# Altium footprint library SAMTEC THD.PcbLib: 161 footprints (part 10 of 12) (continued)
## SAMTEC_TSW-110-07-L-D-LL [mm] "20 Contacts, Pitch 2.54mm - Dual Row, Through Mount Straigh Header" (continued)
  text "1" at -13.677,-1.768 h1.2
Mechanical 8:
  lines w0.05: -11.93,-1.27 -11.43,-1.27 ; -11.93,1.27 -11.43,1.27 ; -11.43,-1.77 -11.43,-1.27 ; -11.43,-0.77 -11.43,-1.27 ; -11.43,0.77 -11.43,1.27 ; -11.43,1.77 -11.43,1.27 ; -10.93,-1.27 -11.43,-1.27 ; -10.93,1.27 -11.43,1.27 ; -9.39,-1.27 -8.89,-1.27 ; -9.39,1.27 -8.89,1.27 ; -8.89,-1.77 -8.89,-1.27 ; -8.89,-0.77 -8.89,-1.27 ; -8.89,0.77 -8.89,1.27 ; -8.89,1.77 -8.89,1.27 ; -8.39,-1.27 -8.89,-1.27 ; -8.39,1.27 -8.89,1.27 ; -6.85,-1.27 -6.35,-1.27 ; -6.85,1.27 -6.35,1.27 ; -6.35,-1.77 -6.35,-1.27 ; -6.35,-0.77 -6.35,-1.27 ; -6.35,0.77 -6.35,1.27 ; -6.35,1.77 -6.35,1.27 ; -5.85,-1.27 -6.35,-1.27 ; -5.85,1.27 -6.35,1.27 ; -4.31,-1.27 -3.81,-1.27 ; -4.31,1.27 -3.81,1.27 ; -3.81,-1.77 -3.81,-1.27 ; -3.81,-0.77 -3.81,-1.27 ; -3.81,0.77 -3.81,1.27 ; -3.81,1.77 -3.81,1.27 ; -3.31,-1.27 -3.81,-1.27 ; -3.31,1.27 -3.81,1.27 ; -1.77,-1.27 -1.27,-1.27 ; -1.77,1.27 -1.27,1.27 ; -1.27,-1.77 -1.27,-1.27 ; -1.27,-0.77 -1.27,-1.27 ; -1.27,0.77 -1.27,1.27 ; -1.27,1.77 -1.27,1.27 ; -0.77,-1.27 -1.27,-1.27 ; -0.77,1.27 -1.27,1.27 ; -0.5,0 0,0 ; 0,-0.5 0,0 ; 0,0.5 0,0 ; 0.5,0 0,0 ; 0.77,-1.27 1.27,-1.27 ; 0.77,1.27 1.27,1.27 ; 1.27,-1.77 1.27,-1.27 ; 1.27,-0.77 1.27,-1.27 ; 1.27,0.77 1.27,1.27 ; 1.27,1.77 1.27,1.27 ; 1.77,-1.27 1.27,-1.27 ; 1.77,1.27 1.27,1.27 ; 3.31,-1.27 3.81,-1.27 ; 3.31,1.27 3.81,1.27 ; 3.81,-1.77 3.81,-1.27 ; 3.81,-0.77 3.81,-1.27 ; 3.81,0.77 3.81,1.27 ; 3.81,1.77 3.81,1.27 ; 4.31,-1.27 3.81,-1.27 ; 4.31,1.27 3.81,1.27 ; 5.85,-1.27 6.35,-1.27 ; 5.85,1.27 6.35,1.27 ; 6.35,-1.77 6.35,-1.27 ; 6.35,-0.77 6.35,-1.27 ; 6.35,0.77 6.35,1.27 ; 6.35,1.77 6.35,1.27 ; 6.85,-1.27 6.35,-1.27 ; 6.85,1.27 6.35,1.27 ; 8.39,-1.27 8.89,-1.27 ; 8.39,1.27 8.89,1.27 ; 8.89,-1.77 8.89,-1.27 ; 8.89,-0.77 8.89,-1.27 ; 8.89,0.77 8.89,1.27 ; 8.89,1.77 8.89,1.27 ; 9.39,-1.27 8.89,-1.27 ; 9.39,1.27 8.89,1.27 ; 10.93,-1.27 11.43,-1.27 ; 10.93,1.27 11.43,1.27 ; 11.43,-1.77 11.43,-1.27 ; 11.43,-0.77 11.43,-1.27 ; 11.43,0.77 11.43,1.27 ; 11.43,1.77 11.43,1.27 ; 11.93,-1.27 11.43,-1.27 ; 11.93,1.27 11.43,1.27
Mechanical 14:
  drawing of 389 lines, arcs and shapes, not listed
  text "1" at -13.677,-1.768 h1.2
3D body "SAMTEC_TSW-110-07-L-D-LL.stp": height 8.38, standoff -2.54, extent -12.7,-2.54 12.7,2.54

## SAMTEC_TSW-110-08-G-D [mm] "20 Contacts - Pitch 2.54mm - Dual Row  Through Mount Straigh Header (Post Lead 5.84mm, Tail Lead 5.08mm, Insulator 2.54mm)"
height 8.38
pads (20):
  round 1.7 hole 1: 1(-11.43,-1.27) 2(-11.43,1.27) 3(-8.89,-1.27) 4(-8.89,1.27) 5(-6.35,-1.27) 6(-6.35,1.27) 7(-3.81,-1.27) 8(-3.81,1.27) 9(-1.27,-1.27) 10(-1.27,1.27) 11(1.27,-1.27) 12(1.27,1.27) 13(3.81,-1.27) 14(3.81,1.27) 15(6.35,-1.27) 16(6.35,1.27) 17(8.89,-1.27) 18(8.89,1.27) 19(11.43,-1.27) 20(11.43,1.27)
Top Overlay:
  circle w0.3: c-11.395,-3.135 r0.15
  lines w0.2: -12.7,-2.54 -10.414,-2.54 -10.414,-2.286 -9.906,-2.286 -9.906,-2.54 -7.874,-2.54 -7.874,-2.286 -7.366,-2.286 -7.366,-2.54 -5.334,-2.54 -5.334,-2.286 -4.826,-2.286 -4.826,-2.54 -2.794,-2.54 -2.794,-2.286 -2.286,-2.286 -2.286,-2.54 -0.254,-2.54 -0.254,-2.286 0.254,-2.286 0.254,-2.54 2.286,-2.54 2.286,-2.286 2.794,-2.286 2.794,-2.54 4.826,-2.54 4.826,-2.286 5.334,-2.286 5.334,-2.54 7.366,-2.54 7.366,-2.286 7.874,-2.286 7.874,-2.54 9.906,-2.54 9.906,-2.286 10.414,-2.286 10.414,-2.54 12.7,-2.54 12.7,2.54 10.414,2.54 10.414,2.286 9.906,2.286 9.906,2.54 7.874,2.54 7.874,2.286 7.366,2.286 7.366,2.54 5.334,2.54 5.334,2.286 4.826,2.286 4.826,2.54 2.794,2.54 2.794,2.286 2.286,2.286 2.286,2.54 0.254,2.54 0.254,2.286 -0.254,2.286 -0.254,2.54 -2.286,2.54 -2.286,2.286 -2.794,2.286 -2.794,2.54 -4.826,2.54 -4.826,2.286 -5.334,2.286 -5.334,2.54 -7.366,2.54 -7.366,2.286 -7.874,2.286 -7.874,2.54 -9.906,2.54 -9.906,2.286 -10.414,2.286 -10.414,2.54 -12.7,2.54 -12.7,-2.54
  text "1" at -13.802,-1.768 h1.2
Mechanical 8:
  lines w0.05: -11.93,-1.27 -11.43,-1.27 ; -11.93,1.27 -11.43,1.27 ; -11.43,-1.77 -11.43,-1.27 ; -11.43,-0.77 -11.43,-1.27 ; -11.43,0.77 -11.43,1.27 ; -11.43,1.77 -11.43,1.27 ; -10.93,-1.27 -11.43,-1.27 ; -10.93,1.27 -11.43,1.27 ; -9.39,-1.27 -8.89,-1.27 ; -9.39,1.27 -8.89,1.27 ; -8.89,-1.77 -8.89,-1.27 ; -8.89,-0.77 -8.89,-1.27 ; -8.89,0.77 -8.89,1.27 ; -8.89,1.77 -8.89,1.27 ; -8.39,-1.27 -8.89,-1.27 ; -8.39,1.27 -8.89,1.27 ; -6.85,-1.27 -6.35,-1.27 ; -6.85,1.27 -6.35,1.27 ; -6.35,-1.77 -6.35,-1.27 ; -6.35,-0.77 -6.35,-1.27 ; -6.35,0.77 -6.35,1.27 ; -6.35,1.77 -6.35,1.27 ; -5.85,-1.27 -6.35,-1.27 ; -5.85,1.27 -6.35,1.27 ; -4.31,-1.27 -3.81,-1.27 ; -4.31,1.27 -3.81,1.27 ; -3.81,-1.77 -3.81,-1.27 ; -3.81,-0.77 -3.81,-1.27 ; -3.81,0.77 -3.81,1.27 ; -3.81,1.77 -3.81,1.27 ; -3.31,-1.27 -3.81,-1.27 ; -3.31,1.27 -3.81,1.27 ; -1.77,-1.27 -1.27,-1.27 ; -1.77,1.27 -1.27,1.27 ; -1.27,-1.77 -1.27,-1.27 ; -1.27,-0.77 -1.27,-1.27 ; -1.27,0.77 -1.27,1.27 ; -1.27,1.77 -1.27,1.27 ; -0.77,-1.27 -1.27,-1.27 ; -0.77,1.27 -1.27,1.27 ; -0.5,0 0,0 ; 0,-0.5 0,0 ; 0,0.5 0,0 ; 0.5,0 0,0 ; 0.77,-1.27 1.27,-1.27 ; 0.77,1.27 1.27,1.27 ; 1.27,-1.77 1.27,-1.27 ; 1.27,-0.77 1.27,-1.27 ; 1.27,0.77 1.27,1.27 ; 1.27,1.77 1.27,1.27 ; 1.77,-1.27 1.27,-1.27 ; 1.77,1.27 1.27,1.27 ; 3.31,-1.27 3.81,-1.27 ; 3.31,1.27 3.81,1.27 ; 3.81,-1.77 3.81,-1.27 ; 3.81,-0.77 3.81,-1.27 ; 3.81,0.77 3.81,1.27 ; 3.81,1.77 3.81,1.27 ; 4.31,-1.27 3.81,-1.27 ; 4.31,1.27 3.81,1.27 ; 5.85,-1.27 6.35,-1.27 ; 5.85,1.27 6.35,1.27 ; 6.35,-1.77 6.35,-1.27 ; 6.35,-0.77 6.35,-1.27 ; 6.35,0.77 6.35,1.27 ; 6.35,1.77 6.35,1.27 ; 6.85,-1.27 6.35,-1.27 ; 6.85,1.27 6.35,1.27 ; 8.39,-1.27 8.89,-1.27 ; 8.39,1.27 8.89,1.27 ; 8.89,-1.77 8.89,-1.27 ; 8.89,-0.77 8.89,-1.27 ; 8.89,0.77 8.89,1.27 ; 8.89,1.77 8.89,1.27 ; 9.39,-1.27 8.89,-1.27 ; 9.39,1.27 8.89,1.27 ; 10.93,-1.27 11.43,-1.27 ; 10.93,1.27 11.43,1.27 ; 11.43,-1.77 11.43,-1.27 ; 11.43,-0.77 11.43,-1.27 ; 11.43,0.77 11.43,1.27 ; 11.43,1.77 11.43,1.27 ; 11.93,-1.27 11.43,-1.27 ; 11.93,1.27 11.43,1.27
Mechanical 14:
  lines w0.1: -10.414,-2.286 -9.906,-2.286 ; -10.414,-0.508 -9.906,-0.508 ; -10.414,0.508 -9.906,0.508 ; -10.414,2.286 -9.906,2.286 ; -7.874,-2.286 -7.366,-2.286 ; -7.874,-0.508 -7.366,-0.508 ; -7.874,0.508 -7.366,0.508 ; -7.874,2.286 -7.366,2.286 ; -5.334,-2.286 -4.826,-2.286 ; -5.334,-0.508 -4.826,-0.508 ; -5.334,0.508 -4.826,0.508 ; -5.334,2.286 -4.826,2.286 ; -2.794,-2.286 -2.286,-2.286 ; -2.794,-0.508 -2.286,-0.508 ; -2.794,0.508 -2.286,0.508 ; -2.794,2.286 -2.286,2.286 ; -0.254,-2.286 0.254,-2.286 ; -0.254,-0.508 0.254,-0.508 ; -0.254,0.508 0.254,0.508 ; -0.254,2.286 0.254,2.286 ; 2.286,-2.286 2.794,-2.286 ; 2.286,-0.508 2.794,-0.508 ; 2.286,0.508 2.794,0.508 ; 2.286,2.286 2.794,2.286 ; 4.826,-2.286 5.334,-2.286 ; 4.826,-0.508 5.334,-0.508 ; 4.826,0.508 5.334,0.508 ; 4.826,2.286 5.334,2.286 ; 7.366,-2.286 7.874,-2.286 ; 7.366,-0.508 7.874,-0.508 ; 7.366,0.508 7.874,0.508 ; 7.366,2.286 7.874,2.286 ; 9.906,-2.286 10.414,-2.286 ; 9.906,-0.508 10.414,-0.508 ; 9.906,0.508 10.414,0.508 ; 9.906,2.286 10.414,2.286 ; -12.7,-2.54 -12.7,2.54 -10.414,2.54 -10.414,-2.54 -12.7,-2.54 ; -9.906,-2.54 -9.906,2.54 -7.874,2.54 -7.874,-2.54 -9.906,-2.54 ; -7.366,-2.54 -7.366,2.54 -5.334,2.54 -5.334,-2.54 -7.366,-2.54 ; -4.826,-2.54 -4.826,2.54 -2.794,2.54 -2.794,-2.54 -4.826,-2.54 ; -2.286,-2.54 -2.286,2.54 -0.254,2.54 -0.254,-2.54 -2.286,-2.54 ; 0.254,-2.54 0.254,2.54 2.286,2.54 2.286,-2.54 0.254,-2.54 ; 2.794,-2.54 2.794,2.54 4.826,2.54 4.826,-2.54 2.794,-2.54 ; 5.334,-2.54 5.334,2.54 7.366,2.54 7.366,-2.54 5.334,-2.54 ; 7.874,-2.54 7.874,2.54 9.906,2.54 9.906,-2.54 7.874,-2.54 ; 10.414,-2.54 10.414,2.54 12.7,2.54 12.7,-2.54 10.414,-2.54
3D body "SAMTEC_TSW-110-08-G-D.stp": height 8.13, standoff -5.33, extent -12.7,-2.54 12.7,2.54

## SAMTEC_TSW-110-08-L-D [mm] "20 Contacts - Pitch 2.54mm - Dual Row  Through Mount Straigh Header (Post Lead 5.84mm, Tail Lead 5.08mm, Insulator 2.54mm)"
height 8.38
pads (20):
  round 1.7 hole 1: 1(-11.43,-1.27) 2(-11.43,1.27) 3(-8.89,-1.27) 4(-8.89,1.27) 5(-6.35,-1.27) 6(-6.35,1.27) 7(-3.81,-1.27) 8(-3.81,1.27) 9(-1.27,-1.27) 10(-1.27,1.27) 11(1.27,-1.27) 12(1.27,1.27) 13(3.81,-1.27) 14(3.81,1.27) 15(6.35,-1.27) 16(6.35,1.27) 17(8.89,-1.27) 18(8.89,1.27) 19(11.43,-1.27) 20(11.43,1.27)
Top Overlay:
  circle w0.3: c-11.395,-3.135 r0.15
  lines w0.2: -12.7,-2.54 -10.414,-2.54 -10.414,-2.286 -9.906,-2.286 -9.906,-2.54 -7.874,-2.54 -7.874,-2.286 -7.366,-2.286 -7.366,-2.54 -5.334,-2.54 -5.334,-2.286 -4.826,-2.286 -4.826,-2.54 -2.794,-2.54 -2.794,-2.286 -2.286,-2.286 -2.286,-2.54 -0.254,-2.54 -0.254,-2.286 0.254,-2.286 0.254,-2.54 2.286,-2.54 2.286,-2.286 2.794,-2.286 2.794,-2.54 4.826,-2.54 4.826,-2.286 5.334,-2.286 5.334,-2.54 7.366,-2.54 7.366,-2.286 7.874,-2.286 7.874,-2.54 9.906,-2.54 9.906,-2.286 10.414,-2.286 10.414,-2.54 12.7,-2.54 12.7,2.54 10.414,2.54 10.414,2.286 9.906,2.286 9.906,2.54 7.874,2.54 7.874,2.286 7.366,2.286 7.366,2.54 5.334,2.54 5.334,2.286 4.826,2.286 4.826,2.54 2.794,2.54 2.794,2.286 2.286,2.286 2.286,2.54 0.254,2.54 0.254,2.286 -0.254,2.286 -0.254,2.54 -2.286,2.54 -2.286,2.286 -2.794,2.286 -2.794,2.54 -4.826,2.54 -4.826,2.286 -5.334,2.286 -5.334,2.54 -7.366,2.54 -7.366,2.286 -7.874,2.286 -7.874,2.54 -9.906,2.54 -9.906,2.286 -10.414,2.286 -10.414,2.54 -12.7,2.54 -12.7,-2.54
  text "1" at -13.802,-1.768 h1.2
Mechanical 8:
  lines w0.05: -11.93,-1.27 -11.43,-1.27 ; -11.93,1.27 -11.43,1.27 ; -11.43,-1.77 -11.43,-1.27 ; -11.43,-0.77 -11.43,-1.27 ; -11.43,0.77 -11.43,1.27 ; -11.43,1.77 -11.43,1.27 ; -10.93,-1.27 -11.43,-1.27 ; -10.93,1.27 -11.43,1.27 ; -9.39,-1.27 -8.89,-1.27 ; -9.39,1.27 -8.89,1.27 ; -8.89,-1.77 -8.89,-1.27 ; -8.89,-0.77 -8.89,-1.27 ; -8.89,0.77 -8.89,1.27 ; -8.89,1.77 -8.89,1.27 ; -8.39,-1.27 -8.89,-1.27 ; -8.39,1.27 -8.89,1.27 ; -6.85,-1.27 -6.35,-1.27 ; -6.85,1.27 -6.35,1.27 ; -6.35,-1.77 -6.35,-1.27 ; -6.35,-0.77 -6.35,-1.27 ; -6.35,0.77 -6.35,1.27 ; -6.35,1.77 -6.35,1.27 ; -5.85,-1.27 -6.35,-1.27 ; -5.85,1.27 -6.35,1.27 ; -4.31,-1.27 -3.81,-1.27 ; -4.31,1.27 -3.81,1.27 ; -3.81,-1.77 -3.81,-1.27 ; -3.81,-0.77 -3.81,-1.27 ; -3.81,0.77 -3.81,1.27 ; -3.81,1.77 -3.81,1.27 ; -3.31,-1.27 -3.81,-1.27 ; -3.31,1.27 -3.81,1.27 ; -1.77,-1.27 -1.27,-1.27 ; -1.77,1.27 -1.27,1.27 ; -1.27,-1.77 -1.27,-1.27 ; -1.27,-0.77 -1.27,-1.27 ; -1.27,0.77 -1.27,1.27 ; -1.27,1.77 -1.27,1.27 ; -0.77,-1.27 -1.27,-1.27 ; -0.77,1.27 -1.27,1.27 ; -0.5,0 0,0 ; 0,-0.5 0,0 ; 0,0.5 0,0 ; 0.5,0 0,0 ; 0.77,-1.27 1.27,-1.27 ; 0.77,1.27 1.27,1.27 ; 1.27,-1.77 1.27,-1.27 ; 1.27,-0.77 1.27,-1.27 ; 1.27,0.77 1.27,1.27 ; 1.27,1.77 1.27,1.27 ; 1.77,-1.27 1.27,-1.27 ; 1.77,1.27 1.27,1.27 ; 3.31,-1.27 3.81,-1.27 ; 3.31,1.27 3.81,1.27 ; 3.81,-1.77 3.81,-1.27 ; 3.81,-0.77 3.81,-1.27 ; 3.81,0.77 3.81,1.27 ; 3.81,1.77 3.81,1.27 ; 4.31,-1.27 3.81,-1.27 ; 4.31,1.27 3.81,1.27 ; 5.85,-1.27 6.35,-1.27 ; 5.85,1.27 6.35,1.27 ; 6.35,-1.77 6.35,-1.27 ; 6.35,-0.77 6.35,-1.27 ; 6.35,0.77 6.35,1.27 ; 6.35,1.77 6.35,1.27 ; 6.85,-1.27 6.35,-1.27 ; 6.85,1.27 6.35,1.27 ; 8.39,-1.27 8.89,-1.27 ; 8.39,1.27 8.89,1.27 ; 8.89,-1.77 8.89,-1.27 ; 8.89,-0.77 8.89,-1.27 ; 8.89,0.77 8.89,1.27 ; 8.89,1.77 8.89,1.27 ; 9.39,-1.27 8.89,-1.27 ; 9.39,1.27 8.89,1.27 ; 10.93,-1.27 11.43,-1.27 ; 10.93,1.27 11.43,1.27 ; 11.43,-1.77 11.43,-1.27 ; 11.43,-0.77 11.43,-1.27 ; 11.43,0.77 11.43,1.27 ; 11.43,1.77 11.43,1.27 ; 11.93,-1.27 11.43,-1.27 ; 11.93,1.27 11.43,1.27
Mechanical 14:
  lines w0.1: -10.414,-2.286 -9.906,-2.286 ; -10.414,-0.508 -9.906,-0.508 ; -10.414,0.508 -9.906,0.508 ; -10.414,2.286 -9.906,2.286 ; -7.874,-2.286 -7.366,-2.286 ; -7.874,-0.508 -7.366,-0.508 ; -7.874,0.508 -7.366,0.508 ; -7.874,2.286 -7.366,2.286 ; -5.334,-2.286 -4.826,-2.286 ; -5.334,-0.508 -4.826,-0.508 ; -5.334,0.508 -4.826,0.508 ; -5.334,2.286 -4.826,2.286 ; -2.794,-2.286 -2.286,-2.286 ; -2.794,-0.508 -2.286,-0.508 ; -2.794,0.508 -2.286,0.508 ; -2.794,2.286 -2.286,2.286 ; -0.254,-2.286 0.254,-2.286 ; -0.254,-0.508 0.254,-0.508 ; -0.254,0.508 0.254,0.508 ; -0.254,2.286 0.254,2.286 ; 2.286,-2.286 2.794,-2.286 ; 2.286,-0.508 2.794,-0.508 ; 2.286,0.508 2.794,0.508 ; 2.286,2.286 2.794,2.286 ; 4.826,-2.286 5.334,-2.286 ; 4.826,-0.508 5.334,-0.508 ; 4.826,0.508 5.334,0.508 ; 4.826,2.286 5.334,2.286 ; 7.366,-2.286 7.874,-2.286 ; 7.366,-0.508 7.874,-0.508 ; 7.366,0.508 7.874,0.508 ; 7.366,2.286 7.874,2.286 ; 9.906,-2.286 10.414,-2.286 ; 9.906,-0.508 10.414,-0.508 ; 9.906,0.508 10.414,0.508 ; 9.906,2.286 10.414,2.286 ; -12.7,-2.54 -12.7,2.54 -10.414,2.54 -10.414,-2.54 -12.7,-2.54 ; -9.906,-2.54 -9.906,2.54 -7.874,2.54 -7.874,-2.54 -9.906,-2.54 ; -7.366,-2.54 -7.366,2.54 -5.334,2.54 -5.334,-2.54 -7.366,-2.54 ; -4.826,-2.54 -4.826,2.54 -2.794,2.54 -2.794,-2.54 -4.826,-2.54 ; -2.286,-2.54 -2.286,2.54 -0.254,2.54 -0.254,-2.54 -2.286,-2.54 ; 0.254,-2.54 0.254,2.54 2.286,2.54 2.286,-2.54 0.254,-2.54 ; 2.794,-2.54 2.794,2.54 4.826,2.54 4.826,-2.54 2.794,-2.54 ; 5.334,-2.54 5.334,2.54 7.366,2.54 7.366,-2.54 5.334,-2.54 ; 7.874,-2.54 7.874,2.54 9.906,2.54 9.906,-2.54 7.874,-2.54 ; 10.414,-2.54 10.414,2.54 12.7,2.54 12.7,-2.54 10.414,-2.54
3D body "SAMTEC_TSW-110-08-L-D.stp": height 8.13, standoff -5.33, extent -12.7,-2.54 12.7,2.54

## SAMTEC_TSW-110-23-L-D [mm] "20 Contacts - Pitch 2.54mm - Dual Row  Through Mount Straigh Header (Post Lead 5.84mm, Tail Lead 2.92mm, Insulator 2.54mm)"
height 8.38
pads (20):
  round 1.7 hole 1: 1(-11.43,-1.27) 2(-11.43,1.27) 3(-8.89,-1.27) 4(-8.89,1.27) 5(-6.35,-1.27) 6(-6.35,1.27) 7(-3.81,-1.27) 8(-3.81,1.27) 9(-1.27,-1.27) 10(-1.27,1.27) 11(1.27,-1.27) 12(1.27,1.27) 13(3.81,-1.27) 14(3.81,1.27) 15(6.35,-1.27) 16(6.35,1.27) 17(8.89,-1.27) 18(8.89,1.27) 19(11.43,-1.27) 20(11.43,1.27)
Top Overlay:
  circle w0.3: c-11.395,-3.135 r0.15
  lines w0.2: -12.7,-2.54 -10.414,-2.54 -10.414,-2.286 -9.906,-2.286 -9.906,-2.54 -7.874,-2.54 -7.874,-2.286 -7.366,-2.286 -7.366,-2.54 -5.334,-2.54 -5.334,-2.286 -4.826,-2.286 -4.826,-2.54 -2.794,-2.54 -2.794,-2.286 -2.286,-2.286 -2.286,-2.54 -0.254,-2.54 -0.254,-2.286 0.254,-2.286 0.254,-2.54 2.286,-2.54 2.286,-2.286 2.794,-2.286 2.794,-2.54 4.826,-2.54 4.826,-2.286 5.334,-2.286 5.334,-2.54 7.366,-2.54 7.366,-2.286 7.874,-2.286 7.874,-2.54 9.906,-2.54 9.906,-2.286 10.414,-2.286 10.414,-2.54 12.7,-2.54 12.7,2.54 10.414,2.54 10.414,2.286 9.906,2.286 9.906,2.54 7.874,2.54 7.874,2.286 7.366,2.286 7.366,2.54 5.334,2.54 5.334,2.286 4.826,2.286 4.826,2.54 2.794,2.54 2.794,2.286 2.286,2.286 2.286,2.54 0.254,2.54 0.254,2.286 -0.254,2.286 -0.254,2.54 -2.286,2.54 -2.286,2.286 -2.794,2.286 -2.794,2.54 -4.826,2.54 -4.826,2.286 -5.334,2.286 -5.334,2.54 -7.366,2.54 -7.366,2.286 -7.874,2.286 -7.874,2.54 -9.906,2.54 -9.906,2.286 -10.414,2.286 -10.414,2.54 -12.7,2.54 -12.7,-2.54
  text "1" at -13.802,-1.768 h1.2
Mechanical 8:
  lines w0.05: -11.93,-1.27 -11.43,-1.27 ; -11.93,1.27 -11.43,1.27 ; -11.43,-1.77 -11.43,-1.27 ; -11.43,-0.77 -11.43,-1.27 ; -11.43,0.77 -11.43,1.27 ; -11.43,1.77 -11.43,1.27 ; -10.93,-1.27 -11.43,-1.27 ; -10.93,1.27 -11.43,1.27 ; -9.39,-1.27 -8.89,-1.27 ; -9.39,1.27 -8.89,1.27 ; -8.89,-1.77 -8.89,-1.27 ; -8.89,-0.77 -8.89,-1.27 ; -8.89,0.77 -8.89,1.27 ; -8.89,1.77 -8.89,1.27 ; -8.39,-1.27 -8.89,-1.27 ; -8.39,1.27 -8.89,1.27 ; -6.85,-1.27 -6.35,-1.27 ; -6.85,1.27 -6.35,1.27 ; -6.35,-1.77 -6.35,-1.27 ; -6.35,-0.77 -6.35,-1.27 ; -6.35,0.77 -6.35,1.27 ; -6.35,1.77 -6.35,1.27 ; -5.85,-1.27 -6.35,-1.27 ; -5.85,1.27 -6.35,1.27 ; -4.31,-1.27 -3.81,-1.27 ; -4.31,1.27 -3.81,1.27 ; -3.81,-1.77 -3.81,-1.27 ; -3.81,-0.77 -3.81,-1.27 ; -3.81,0.77 -3.81,1.27 ; -3.81,1.77 -3.81,1.27 ; -3.31,-1.27 -3.81,-1.27 ; -3.31,1.27 -3.81,1.27 ; -1.77,-1.27 -1.27,-1.27 ; -1.77,1.27 -1.27,1.27 ; -1.27,-1.77 -1.27,-1.27 ; -1.27,-0.77 -1.27,-1.27 ; -1.27,0.77 -1.27,1.27 ; -1.27,1.77 -1.27,1.27 ; -0.77,-1.27 -1.27,-1.27 ; -0.77,1.27 -1.27,1.27 ; -0.5,0 0,0 ; 0,-0.5 0,0 ; 0,0.5 0,0 ; 0.5,0 0,0 ; 0.77,-1.27 1.27,-1.27 ; 0.77,1.27 1.27,1.27 ; 1.27,-1.77 1.27,-1.27 ; 1.27,-0.77 1.27,-1.27 ; 1.27,0.77 1.27,1.27 ; 1.27,1.77 1.27,1.27 ; 1.77,-1.27 1.27,-1.27 ; 1.77,1.27 1.27,1.27 ; 3.31,-1.27 3.81,-1.27 ; 3.31,1.27 3.81,1.27 ; 3.81,-1.77 3.81,-1.27 ; 3.81,-0.77 3.81,-1.27 ; 3.81,0.77 3.81,1.27 ; 3.81,1.77 3.81,1.27 ; 4.31,-1.27 3.81,-1.27 ; 4.31,1.27 3.81,1.27 ; 5.85,-1.27 6.35,-1.27 ; 5.85,1.27 6.35,1.27 ; 6.35,-1.77 6.35,-1.27 ; 6.35,-0.77 6.35,-1.27 ; 6.35,0.77 6.35,1.27 ; 6.35,1.77 6.35,1.27 ; 6.85,-1.27 6.35,-1.27 ; 6.85,1.27 6.35,1.27 ; 8.39,-1.27 8.89,-1.27 ; 8.39,1.27 8.89,1.27 ; 8.89,-1.77 8.89,-1.27 ; 8.89,-0.77 8.89,-1.27 ; 8.89,0.77 8.89,1.27 ; 8.89,1.77 8.89,1.27 ; 9.39,-1.27 8.89,-1.27 ; 9.39,1.27 8.89,1.27 ; 10.93,-1.27 11.43,-1.27 ; 10.93,1.27 11.43,1.27 ; 11.43,-1.77 11.43,-1.27 ; 11.43,-0.77 11.43,-1.27 ; 11.43,0.77 11.43,1.27 ; 11.43,1.77 11.43,1.27 ; 11.93,-1.27 11.43,-1.27 ; 11.93,1.27 11.43,1.27
Mechanical 14:
  lines w0.1: -10.414,-2.286 -9.906,-2.286 ; -10.414,-0.508 -9.906,-0.508 ; -10.414,0.508 -9.906,0.508 ; -10.414,2.286 -9.906,2.286 ; -7.874,-2.286 -7.366,-2.286 ; -7.874,-0.508 -7.366,-0.508 ; -7.874,0.508 -7.366,0.508 ; -7.874,2.286 -7.366,2.286 ; -5.334,-2.286 -4.826,-2.286 ; -5.334,-0.508 -4.826,-0.508 ; -5.334,0.508 -4.826,0.508 ; -5.334,2.286 -4.826,2.286 ; -2.794,-2.286 -2.286,-2.286 ; -2.794,-0.508 -2.286,-0.508 ; -2.794,0.508 -2.286,0.508 ; -2.794,2.286 -2.286,2.286 ; -0.254,-2.286 0.254,-2.286 ; -0.254,-0.508 0.254,-0.508 ; -0.254,0.508 0.254,0.508 ; -0.254,2.286 0.254,2.286 ; 2.286,-2.286 2.794,-2.286 ; 2.286,-0.508 2.794,-0.508 ; 2.286,0.508 2.794,0.508 ; 2.286,2.286 2.794,2.286 ; 4.826,-2.286 5.334,-2.286 ; 4.826,-0.508 5.334,-0.508 ; 4.826,0.508 5.334,0.508 ; 4.826,2.286 5.334,2.286 ; 7.366,-2.286 7.874,-2.286 ; 7.366,-0.508 7.874,-0.508 ; 7.366,0.508 7.874,0.508 ; 7.366,2.286 7.874,2.286 ; 9.906,-2.286 10.414,-2.286 ; 9.906,-0.508 10.414,-0.508 ; 9.906,0.508 10.414,0.508 ; 9.906,2.286 10.414,2.286 ; -12.7,-2.54 -12.7,2.54 -10.414,2.54 -10.414,-2.54 -12.7,-2.54 ; -9.906,-2.54 -9.906,2.54 -7.874,2.54 -7.874,-2.54 -9.906,-2.54 ; -7.366,-2.54 -7.366,2.54 -5.334,2.54 -5.334,-2.54 -7.366,-2.54 ; -4.826,-2.54 -4.826,2.54 -2.794,2.54 -2.794,-2.54 -4.826,-2.54 ; -2.286,-2.54 -2.286,2.54 -0.254,2.54 -0.254,-2.54 -2.286,-2.54 ; 0.254,-2.54 0.254,2.54 2.286,2.54 2.286,-2.54 0.254,-2.54 ; 2.794,-2.54 2.794,2.54 4.826,2.54 4.826,-2.54 2.794,-2.54 ; 5.334,-2.54 5.334,2.54 7.366,2.54 7.366,-2.54 5.334,-2.54 ; 7.874,-2.54 7.874,2.54 9.906,2.54 9.906,-2.54 7.874,-2.54 ; 10.414,-2.54 10.414,2.54 12.7,2.54 12.7,-2.54 10.414,-2.54
3D body "SAMTEC_TSW-110-23-L-D.stp": height 8.38, standoff -2.92, extent -12.7,-2.54 12.7,2.54

## SAMTEC_TSW-111-23-L-D [mm] "22 Contacts - Pitch 2.54mm - Dual Row  Through Mount Straigh Header (Post Lead 5.84mm, Tail Lead 2.92mm, Insulator 2.54mm)"
height 8.38
pads (22):
  round 1.7 hole 1: 1(-12.7,-1.27) 2(-12.7,1.27) 3(-10.16,-1.27) 4(-10.16,1.27) 5(-7.62,-1.27) 6(-7.62,1.27) 7(-5.08,-1.27) 8(-5.08,1.27) 9(-2.54,-1.27) 10(-2.54,1.27) 11(0,-1.27) 12(0,1.27) 13(2.54,-1.27) 14(2.54,1.27) 15(5.08,-1.27) 16(5.08,1.27) 17(7.62,-1.27) 18(7.62,1.27) 19(10.16,-1.27) 20(10.16,1.27) 21(12.7,-1.27) 22(12.7,1.27)
Top Overlay:
  circle w0.3: c-12.665,-3.135 r0.15
  lines w0.2: -13.97,-2.54 -13.97,2.54 -11.684,2.54 -11.684,2.286 -11.176,2.286 -11.176,2.54 -9.144,2.54 -9.144,2.286 -8.636,2.286 -8.636,2.54 -6.604,2.54 -6.604,2.286 -6.096,2.286 -6.096,2.54 -4.064,2.54 -4.064,2.286 -3.556,2.286 -3.556,2.54 -1.524,2.54 -1.524,2.286 -1.016,2.286 -1.016,2.54 1.016,2.54 1.016,2.286 1.524,2.286 1.524,2.54 3.556,2.54 3.556,2.286 4.064,2.286 4.064,2.54 6.096,2.54 6.096,2.286 6.604,2.286 6.604,2.54 8.636,2.54 8.636,2.286 9.144,2.286 9.144,2.54 11.176,2.54 11.176,2.286 11.684,2.286 11.684,2.54 13.97,2.54 13.97,-2.54 11.684,-2.54 11.684,-2.286 11.176,-2.286 11.176,-2.54 9.144,-2.54 9.144,-2.286 8.636,-2.286 8.636,-2.54 6.604,-2.54 6.604,-2.286 6.096,-2.286 6.096,-2.54 4.064,-2.54 4.064,-2.286 3.556,-2.286 3.556,-2.54 1.524,-2.54 1.524,-2.286 1.016,-2.286 1.016,-2.54 -1.016,-2.54 -1.016,-2.286 -1.524,-2.286 -1.524,-2.54 -3.556,-2.54 -3.556,-2.286 -4.064,-2.286 -4.064,-2.54 -6.096,-2.54 -6.096,-2.286 -6.604,-2.286 -6.604,-2.54 -8.636,-2.54 -8.636,-2.286 -9.144,-2.286 -9.144,-2.54 -11.176,-2.54 -11.176,-2.286 -11.684,-2.286 -11.684,-2.54 -13.97,-2.54
  text "1" at -15.072,-1.768 h1.2
Mechanical 8:
  lines w0.05: -13.2,-1.27 -12.7,-1.27 ; -13.2,1.27 -12.7,1.27 ; -12.7,-1.77 -12.7,-1.27 ; -12.7,-0.77 -12.7,-1.27 ; -12.7,0.77 -12.7,1.27 ; -12.7,1.77 -12.7,1.27 ; -12.2,-1.27 -12.7,-1.27 ; -12.2,1.27 -12.7,1.27 ; -10.66,-1.27 -10.16,-1.27 ; -10.66,1.27 -10.16,1.27 ; -10.16,-1.77 -10.16,-1.27 ; -10.16,-0.77 -10.16,-1.27 ; -10.16,0.77 -10.16,1.27 ; -10.16,1.77 -10.16,1.27 ; -9.66,-1.27 -10.16,-1.27 ; -9.66,1.27 -10.16,1.27 ; -8.12,-1.27 -7.62,-1.27 ; -8.12,1.27 -7.62,1.27 ; -7.62,-1.77 -7.62,-1.27 ; -7.62,-0.77 -7.62,-1.27 ; -7.62,0.77 -7.62,1.27 ; -7.62,1.77 -7.62,1.27 ; -7.12,-1.27 -7.62,-1.27 ; -7.12,1.27 -7.62,1.27 ; -5.58,-1.27 -5.08,-1.27 ; -5.58,1.27 -5.08,1.27 ; -5.08,-1.77 -5.08,-1.27 ; -5.08,-0.77 -5.08,-1.27 ; -5.08,0.77 -5.08,1.27 ; -5.08,1.77 -5.08,1.27 ; -4.58,-1.27 -5.08,-1.27 ; -4.58,1.27 -5.08,1.27 ; -3.04,-1.27 -2.54,-1.27 ; -3.04,1.27 -2.54,1.27 ; -2.54,-1.77 -2.54,-1.27 ; -2.54,-0.77 -2.54,-1.27 ; -2.54,0.77 -2.54,1.27 ; -2.54,1.77 -2.54,1.27 ; -2.04,-1.27 -2.54,-1.27 ; -2.04,1.27 -2.54,1.27 ; -0.5,-1.27 0,-1.27 ; -0.5,0 0,0 ; -0.5,1.27 0,1.27 ; 0,-1.77 0,-1.27 ; 0,-0.77 0,-1.27 ; 0,-0.5 0,0 ; 0,0.5 0,0 ; 0,0.77 0,1.27 ; 0,1.77 0,1.27 ; 0.5,-1.27 0,-1.27 ; 0.5,0 0,0 ; 0.5,1.27 0,1.27 ; 2.04,-1.27 2.54,-1.27 ; 2.04,1.27 2.54,1.27 ; 2.54,-1.77 2.54,-1.27 ; 2.54,-0.77 2.54,-1.27 ; 2.54,0.77 2.54,1.27 ; 2.54,1.77 2.54,1.27 ; 3.04,-1.27 2.54,-1.27 ; 3.04,1.27 2.54,1.27 ; 4.58,-1.27 5.08,-1.27 ; 4.58,1.27 5.08,1.27 ; 5.08,-1.77 5.08,-1.27 ; 5.08,-0.77 5.08,-1.27 ; 5.08,0.77 5.08,1.27 ; 5.08,1.77 5.08,1.27 ; 5.58,-1.27 5.08,-1.27 ; 5.58,1.27 5.08,1.27 ; 7.12,-1.27 7.62,-1.27 ; 7.12,1.27 7.62,1.27 ; 7.62,-1.77 7.62,-1.27 ; 7.62,-0.77 7.62,-1.27 ; 7.62,0.77 7.62,1.27 ; 7.62,1.77 7.62,1.27 ; 8.12,-1.27 7.62,-1.27 ; 8.12,1.27 7.62,1.27 ; 9.66,-1.27 10.16,-1.27 ; 9.66,1.27 10.16,1.27 ; 10.16,-1.77 10.16,-1.27 ; 10.16,-0.77 10.16,-1.27 ; 10.16,0.77 10.16,1.27 ; 10.16,1.77 10.16,1.27 ; 10.66,-1.27 10.16,-1.27 ; 10.66,1.27 10.16,1.27 ; 12.2,-1.27 12.7,-1.27 ; 12.2,1.27 12.7,1.27 ; 12.7,-1.77 12.7,-1.27 ; 12.7,-0.77 12.7,-1.27 ; 12.7,0.77 12.7,1.27 ; 12.7,1.77 12.7,1.27 ; 13.2,-1.27 12.7,-1.27 ; 13.2,1.27 12.7,1.27
Mechanical 14:
  lines w0.1: -11.684,-2.286 -11.176,-2.286 ; -11.684,-0.508 -11.176,-0.508 ; -11.684,0.508 -11.176,0.508 ; -11.684,2.286 -11.176,2.286 ; -9.144,-2.286 -8.636,-2.286 ; -9.144,-0.508 -8.636,-0.508 ; -9.144,0.508 -8.636,0.508 ; -9.144,2.286 -8.636,2.286 ; -6.604,-2.286 -6.096,-2.286 ; -6.604,-0.508 -6.096,-0.508 ; -6.604,0.508 -6.096,0.508 ; -6.604,2.286 -6.096,2.286 ; -4.064,-2.286 -3.556,-2.286 ; -4.064,-0.508 -3.556,-0.508 ; -4.064,0.508 -3.556,0.508 ; -4.064,2.286 -3.556,2.286 ; -1.524,-2.286 -1.016,-2.286 ; -1.524,-0.508 -1.016,-0.508 ; -1.524,0.508 -1.016,0.508 ; -1.524,2.286 -1.016,2.286 ; 1.016,-2.286 1.524,-2.286 ; 1.016,-0.508 1.524,-0.508 ; 1.016,0.508 1.524,0.508 ; 1.016,2.286 1.524,2.286 ; 3.556,-2.286 4.064,-2.286 ; 3.556,-0.508 4.064,-0.508 ; 3.556,0.508 4.064,0.508 ; 3.556,2.286 4.064,2.286 ; 6.096,-2.286 6.604,-2.286 ; 6.096,-0.508 6.604,-0.508 ; 6.096,0.508 6.604,0.508 ; 6.096,2.286 6.604,2.286 ; 8.636,-2.286 9.144,-2.286 ; 8.636,-0.508 9.144,-0.508 ; 8.636,0.508 9.144,0.508 ; 8.636,2.286 9.144,2.286 ; 11.176,-2.286 11.684,-2.286 ; 11.176,-0.508 11.684,-0.508 ; 11.176,0.508 11.684,0.508 ; 11.176,2.286 11.684,2.286 ; -13.97,-2.54 -11.684,-2.54 -11.684,2.54 -13.97,2.54 -13.97,-2.54 ; -11.176,-2.54 -9.144,-2.54 -9.144,2.54 -11.176,2.54 -11.176,-2.54 ; -8.636,-2.54 -8.636,2.54 -6.604,2.54 -6.604,-2.54 -8.636,-2.54 ; -6.096,-2.54 -4.064,-2.54 -4.064,2.54 -6.096,2.54 -6.096,-2.54 ; -3.556,-2.54 -1.524,-2.54 -1.524,2.54 -3.556,2.54 -3.556,-2.54 ; -1.016,-2.54 1.016,-2.54 1.016,2.54 -1.016,2.54 -1.016,-2.54 ; 1.524,-2.54 3.556,-2.54 3.556,2.54 1.524,2.54 1.524,-2.54 ; 4.064,-2.54 6.096,-2.54 6.096,2.54 4.064,2.54 4.064,-2.54 ; 6.604,-2.54 8.636,-2.54 8.636,2.54 6.604,2.54 6.604,-2.54 ; 9.144,-2.54 11.176,-2.54 11.176,2.54 9.144,2.54 9.144,-2.54 ; 11.684,-2.54 13.97,-2.54 13.97,2.54 11.684,2.54 11.684,-2.54
3D body "SAMTEC_TSW-111-23-L-D.stp": height 8.38, standoff -2.92, extent -13.97,-2.54 13.97,2.54